# Altium footprint library hphonglib.PcbLib: 703 footprints (part 10 of 44)
Each footprint in its own frame and in the unit in brackets; x right, y up, seen from the top. Pads: shape width x height; smd on the part's side, far side on the other; paste and mask are expansions set on the pad; w line width, h text height; cw(c..) or ccw(c..) is an arc to the next point about the centre after c.
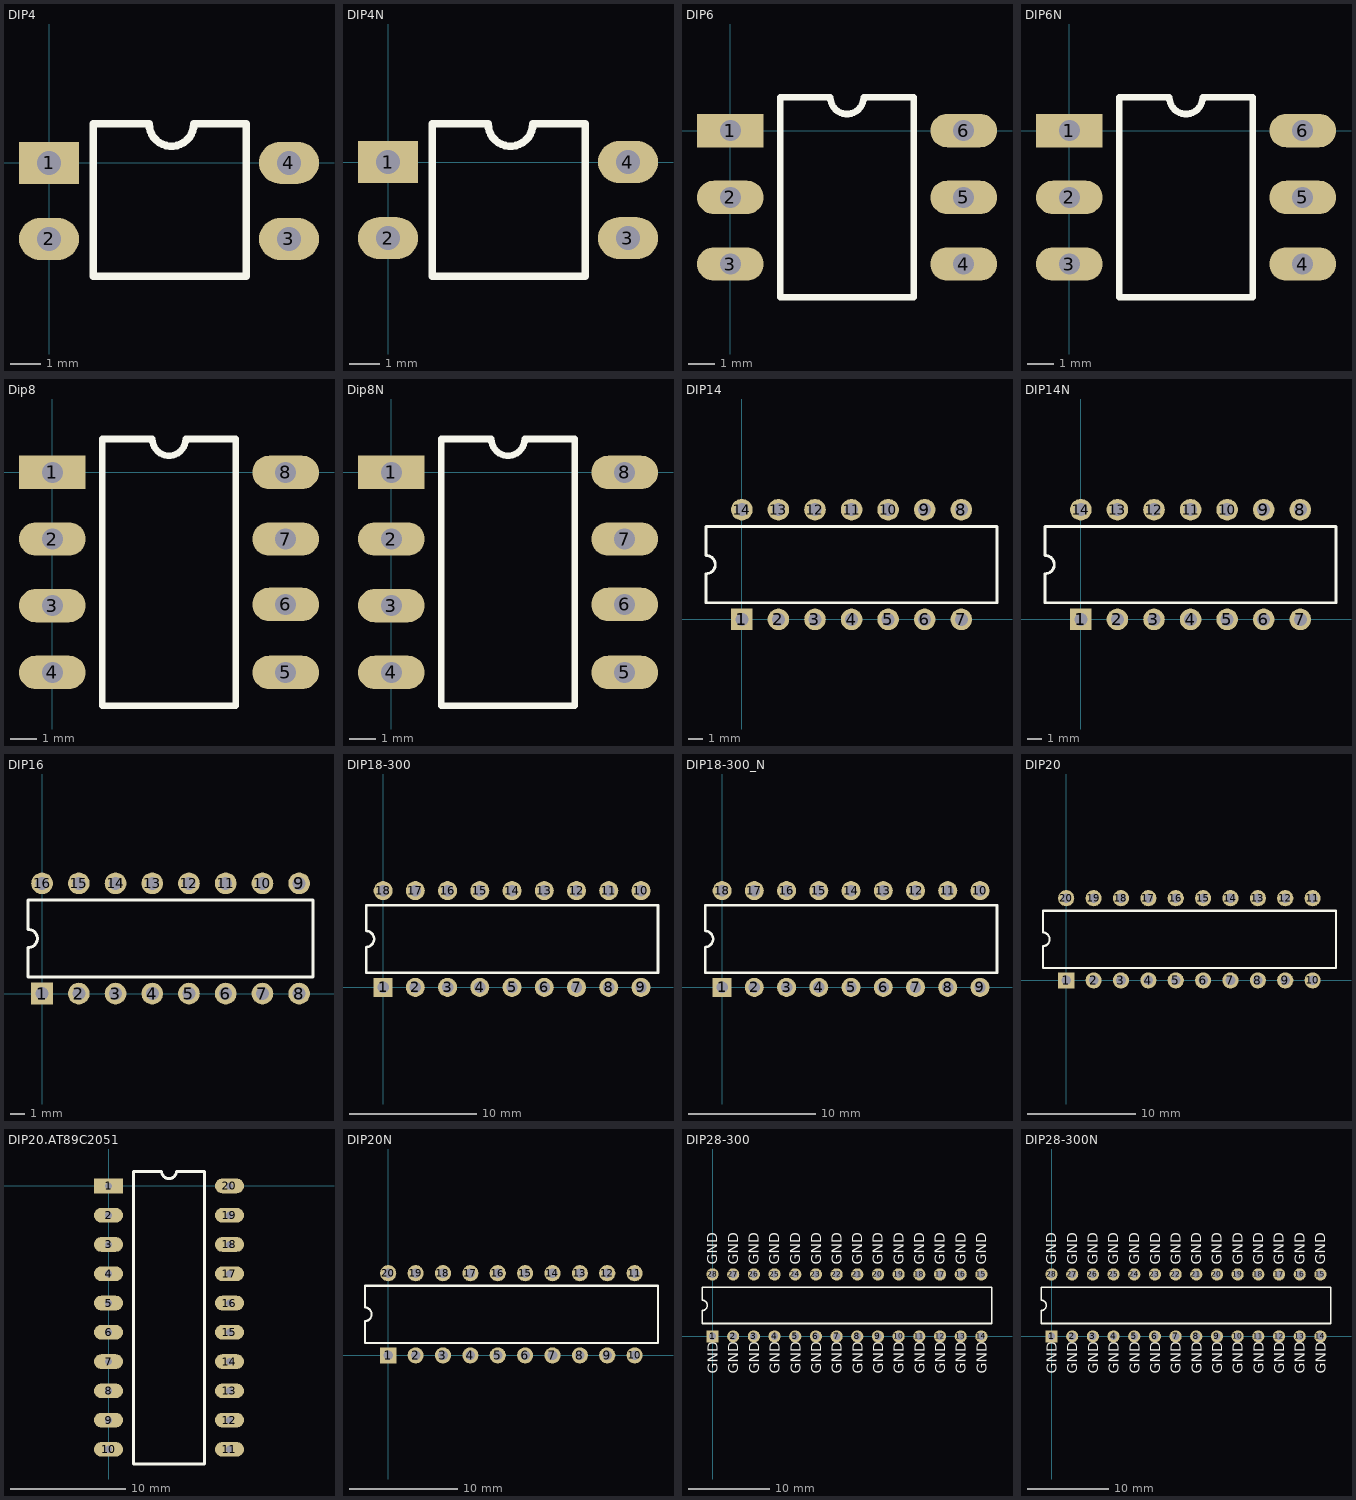
[diagram p9: the footprints below, top view; thin cyan lines are the x and y axes]

## DIP4 [mm]
pads (4):
  rect 2x1.4 hole 0.8: 1(0,0)
  oval 2x1.4 hole 0.8: 2(0,-2.54) 3(8,-2.54) 4(8,0)
Top Overlay:
  lines w0.254: 3.258,1.295 1.48,1.295 1.48,-3.785 6.57,-3.785 6.57,1.295 4.825,1.295 cw(c4.082,1.295) 3.34,1.295
3D body: height 3, standoff 0.5, extent -0.17,-3.281 0.18,-1.782
3D body: height 0.5, standoff -3.8, extent -0.17,-2.807 0.18,-2.257
3D body: height 3, standoff 2.65, extent 0.005,-0.741 1.705,0.758
3D body: height 3, standoff 0.5, extent -0.17,-0.741 0.18,0.758
3D body: height 0.5, standoff -3.8, extent -0.17,-0.267 0.18,0.283
3D body: height 3, standoff 2.65, extent 0.005,-3.282 1.705,-1.782
3D body: height 5.3, standoff 0.3, extent 1.48,-3.725 6.58,1.295
3D body: height 3, standoff 2.65, extent 6.31,-0.757 8.01,0.743
3D body: height 3, standoff 0.5, extent 7.835,-0.757 8.185,0.743
3D body: height 0.5, standoff -3.8, extent 7.835,-0.282 8.185,0.268
3D body: height 3, standoff 0.5, extent 7.835,-3.297 8.185,-1.797
3D body: height 0.5, standoff -3.8, extent 7.835,-2.822 8.185,-2.272
3D body: height 3, standoff 2.65, extent 6.31,-3.297 8.01,-1.797
3D body: height 5.4, standoff 4, extent 3.086,0.333 5.103,1.341

## DIP4N [mm]
pads (4):
  rect 2x1.4 hole 0.8: 1(0,0)
  oval 2x1.4 hole 0.8: 2(0,-2.54) 3(8,-2.54) 4(8,0)
Top Overlay:
  lines w0.254: 3.258,1.27 1.48,1.27 1.48,-3.81 6.57,-3.81 6.57,1.27 4.825,1.27 cw(c4.082,1.27) 3.34,1.27
3D body: height 4.81, standoff -2.78, extent -0.025,-4.015 7.975,1.525

## DIP6 [mm]
pads (6):
  rect 2.54x1.27 hole 0.8: 1(0,0)
  oval 2.54x1.27 hole 0.8: 2(0,-2.54) 3(0,-5.08) 4(8.89,-5.08) 5(8.89,-2.54) 6(8.89,0)
Top Overlay:
  lines w0.254: 1.905,-6.35 6.985,-6.35 6.985,1.27 5.08,1.27 cw(c4.445,1.27) 3.81,1.27 1.905,1.27 1.905,-6.35
3D body: height 5.3, standoff 0.3, extent 1.905,-6.35 6.985,1.287
3D body: height 3, standoff 2.65, extent 0.205,-0.75 1.905,0.75
3D body: height 3, standoff 0.5, extent 0.03,-0.75 0.38,0.75
3D body: height 0.5, standoff -3.8, extent 0.03,-0.275 0.38,0.275
3D body: height 3, standoff 2.65, extent 0.205,-3.29 1.905,-1.79
3D body: height 3, standoff 0.5, extent 0.03,-3.29 0.38,-1.79
3D body: height 0.5, standoff -3.8, extent 0.03,-2.815 0.38,-2.265
3D body: height 3, standoff 2.65, extent 0.205,-5.83 1.905,-4.33
3D body: height 3, standoff 0.5, extent 0.03,-5.83 0.38,-4.33
3D body: height 0.5, standoff -3.8, extent 0.03,-5.355 0.38,-4.805
3D body: height 3, standoff 2.65, extent 6.985,-5.83 8.685,-4.33
3D body: height 3, standoff 0.5, extent 8.51,-5.83 8.86,-4.33
3D body: height 0.5, standoff -3.8, extent 8.51,-5.355 8.86,-4.805
3D body: height 3, standoff 2.65, extent 6.985,-3.29 8.685,-1.79
3D body: height 3, standoff 0.5, extent 8.51,-3.29 8.86,-1.79
3D body: height 0.5, standoff -3.8, extent 8.51,-2.815 8.86,-2.265
3D body: height 3, standoff 2.65, extent 6.985,-0.75 8.685,0.75
3D body: height 3, standoff 0.5, extent 8.51,-0.75 8.86,0.75
3D body: height 0.5, standoff -3.8, extent 8.51,-0.275 8.86,0.275
3D body: height 5.4, standoff 4, extent 3.441,0.278 5.458,1.287

## DIP6N [mm]
pads (6):
  rect 2.54x1.27 hole 0.8: 1(0,0)
  oval 2.54x1.27 hole 0.8: 2(0,-2.54) 3(0,-5.08) 4(8.89,-5.08) 5(8.89,-2.54) 6(8.89,0)
Top Overlay:
  lines w0.254: 1.905,-6.35 6.985,-6.35 6.985,1.27 5.08,1.27 cw(c4.445,1.27) 3.81,1.27 1.905,1.27 1.905,-6.35
3D body: height 4.51, standoff -3.08, extent 0.475,-6.53 8.475,1.55

## Dip8 [mm] "Dual Inline Package 8 pins"
pads (8):
  rect 2.54x1.27 hole 0.8: 1(0,0)
  oval 2.54x1.27 hole 0.8: 2(0,-2.54) 3(0,-5.08) 4(0,-7.62) 5(8.89,-7.62) 6(8.89,-5.03) 7(8.89,-2.54) 8(8.89,0)
Top Overlay:
  lines w0.254: 1.905,-8.89 6.985,-8.89 6.985,1.27 5.08,1.27 cw(c4.445,1.27) 3.81,1.27 1.905,1.27 1.905,-8.89
3D body: height 0.5, standoff -3.8, extent 8.42,-7.945 8.77,-7.395
3D body: height 3, standoff 0.5, extent 8.42,-8.42 8.77,-6.92
3D body: height 3, standoff 2.65, extent 6.895,-8.37 8.595,-6.87
3D body: height 3, standoff 2.65, extent 0.205,-8.37 1.905,-6.87
3D body: height 5.3, standoff 0.3, extent 1.905,-8.89 6.985,1.27
3D body: height 3, standoff 2.65, extent 0.205,-0.75 1.905,0.75
3D body: height 3, standoff 0.5, extent 0.03,-0.75 0.38,0.75
3D body: height 0.5, standoff -3.8, extent 0.03,-0.275 0.38,0.275
3D body: height 3, standoff 2.65, extent 0.205,-3.29 1.905,-1.79
3D body: height 3, standoff 0.5, extent 0.03,-3.29 0.38,-1.79
3D body: height 0.5, standoff -3.8, extent 0.03,-2.815 0.38,-2.265
3D body: height 3, standoff 2.65, extent 0.205,-5.83 1.905,-4.33
3D body: height 3, standoff 0.5, extent 0.03,-5.83 0.38,-4.33
3D body: height 0.5, standoff -3.8, extent 0.03,-5.355 0.38,-4.805
3D body: height 3, standoff 2.65, extent 6.895,-5.83 8.595,-4.33
3D body: height 3, standoff 0.5, extent 8.42,-5.83 8.77,-4.33
3D body: height 0.5, standoff -3.8, extent 8.42,-5.355 8.77,-4.805
3D body: height 3, standoff 2.65, extent 6.895,-3.29 8.595,-1.79
3D body: height 3, standoff 0.5, extent 8.42,-3.29 8.77,-1.79
3D body: height 0.5, standoff -3.8, extent 8.42,-2.815 8.77,-2.265
3D body: height 3, standoff 2.65, extent 6.895,-0.75 8.595,0.75
3D body: height 3, standoff 0.5, extent 8.42,-0.75 8.77,0.75
3D body: height 0.5, standoff -3.8, extent 8.42,-0.275 8.77,0.275
3D body: height 0.5, standoff -3.8, extent 0.03,-7.895 0.38,-7.345
3D body: height 3, standoff 0.5, extent 0.03,-8.37 0.38,-6.87
3D body: height 5.4, standoff 4, extent 3.441,0.261 5.458,1.27

## Dip8N [mm] "Dual Inline Package 8 pins"
pads (8):
  rect 2.54x1.27 hole 0.8: 1(0,0)
  oval 2.54x1.27 hole 0.8: 2(0,-2.54) 3(0,-5.08) 4(0,-7.62) 5(8.89,-7.62) 6(8.89,-5.03) 7(8.89,-2.54) 8(8.89,0)
Top Overlay:
  lines w0.254: 1.905,-8.89 1.905,1.27 3.81,1.27 ccw(c4.445,1.27) 5.08,1.27 6.985,1.27 6.985,-8.89 1.905,-8.89
3D body: height 5.19, standoff -1.67, extent 0.538,-9.55 8.412,1.88

## DIP14 [mm] "DIP; 14 Leads; Row Spacing 7.62 mm; Pitch 2.54 mm"
height 4.42
pads (14):
  rect 1.5x1.5 hole 0.9: 1(0,0)
  round 1.5 hole 0.9: 2(2.54,0) 3(5.08,0) 4(7.62,0) 5(10.16,0) 6(12.7,0) 7(15.24,0) 8(15.24,7.62) 9(12.7,7.62) 10(10.16,7.62) 11(7.62,7.62) 12(5.08,7.62) 13(2.54,7.62) 14(0,7.62)
Top Overlay:
  lines w0.2: -2.48,1.16 17.72,1.16 17.72,6.46 -2.48,6.46 -2.48,4.445 cw(c-2.48,3.81) -2.48,3.175 -2.48,1.16
Bottom Overlay:
  lines w0.254: -1.475,-1.175 17,-1.175 17,8.875 -1.475,8.875 -1.475,-1.175

## DIP14N [mm] "DIP; 14 Leads; Row Spacing 7.62 mm; Pitch 2.54 mm"
height 4.42
pads (14):
  rect 1.5x1.5 hole 0.9: 1(0,0)
  round 1.5 hole 0.9: 2(2.54,0) 3(5.08,0) 4(7.62,0) 5(10.16,0) 6(12.7,0) 7(15.24,0) 8(15.24,7.62) 9(12.7,7.62) 10(10.16,7.62) 11(7.62,7.62) 12(5.08,7.62) 13(2.54,7.62) 14(0,7.62)
Top Overlay:
  lines w0.2: -2.48,1.16 -2.48,3.175 ccw(c-2.48,3.81) -2.48,4.445 -2.48,6.46 17.72,6.46 17.72,1.16 -2.48,1.16
Bottom Overlay:
  lines w0.254: -2.25,-1.175 -2.25,8.875 17.55,8.875 17.55,-1.175 -2.25,-1.175
3D body: height 5.58, standoff -1.99, extent -2.25,-0.145 17.25,7.725

## DIP16 [mm] "DIP; 16 Leads; Row Spacing 7.62 mm; Pitch 2.54 mm"
height 4.58
pads (16):
  rect 1.5x1.5 hole 0.9: 1(0,0)
  round 1.5 hole 0.9: 2(2.54,0) 3(5.08,0) 4(7.62,0) 5(10.16,0) 6(12.7,0) 7(15.24,0) 8(17.78,0) 9(17.78,7.62) 10(15.24,7.62) 11(12.7,7.62) 12(10.16,7.62) 13(7.62,7.62) 14(5.08,7.62) 15(2.54,7.62) 16(0,7.62)
Top Overlay:
  lines w0.2: -0.96,1.16 -0.96,3.175 ccw(c-0.96,3.81) -0.96,4.445 -0.96,6.46 18.74,6.46 18.74,1.16 -0.96,1.16
Bottom Overlay:
  lines w0.254: -1.35,-1.175 -1.35,8.725 19.15,8.725 19.15,-1.175 -1.35,-1.175
3D body: height 5.08, standoff -2.49, extent -1.15,-0.145 18.85,7.725

## DIP18-300 [mm] "DIP, Plastic; 18 Leads; Row Spacing 7.62 mm; Pitch 2.54 mm"
height 4.32
pads (18):
  rect 1.5x1.5 hole 0.9: 1(0,0)
  round 1.5 hole 0.9: 2(2.54,0) 3(5.08,0) 4(7.62,0) 5(10.16,0) 6(12.7,0) 7(15.24,0) 8(17.78,0) 9(20.32,0) 10(20.32,7.62) 11(17.78,7.62) 12(15.24,7.62) 13(12.7,7.62) 14(10.16,7.62) 15(7.62,7.62) 16(5.08,7.62) 17(2.54,7.62) 18(0,7.62)
Top Overlay:
  lines w0.2: -1.34,1.16 21.66,1.16 21.66,6.46 -1.34,6.46 -1.34,4.445 cw(c-1.34,3.81) -1.34,3.175 -1.34,1.16

## DIP18-300_N [mm] "DIP, Plastic; 18 Leads; Row Spacing 7.62 mm; Pitch 2.54 mm"
height 4.32
pads (18):
  rect 1.5x1.5 hole 0.9: 1(0,0)
  round 1.5 hole 0.9: 2(2.54,0) 3(5.08,0) 4(7.62,0) 5(10.16,0) 6(12.7,0) 7(15.24,0) 8(17.78,0) 9(20.32,0) 10(20.32,7.62) 11(17.78,7.62) 12(15.24,7.62) 13(12.7,7.62) 14(10.16,7.62) 15(7.62,7.62) 16(5.08,7.62) 17(2.54,7.62) 18(0,7.62)
Top Overlay:
  lines w0.2: -1.34,1.16 -1.34,3.175 ccw(c-1.34,3.81) -1.34,4.445 -1.34,6.46 21.66,6.46 21.66,1.16 -1.34,1.16

## DIP20 [mm] "DIP; 20 Leads; Row Spacing 7.62 mm; Pitch 2.54 mm"
height 4.58
pads (20):
  rect 1.5x1.5 hole 0.9: 1(0,0)
  round 1.5 hole 0.9: 2(2.54,0) 3(5.08,0) 4(7.62,0) 5(10.16,0) 6(12.7,0) 7(15.24,0) 8(17.78,0) 9(20.32,0) 10(22.86,0) 11(22.86,7.62) 12(20.32,7.62) 13(17.78,7.62) 14(15.24,7.62) 15(12.7,7.62) 16(10.16,7.62) 17(7.62,7.62) 18(5.08,7.62) 19(2.54,7.62) 20(0,7.62)
Top Overlay:
  lines w0.2: -2.17,1.16 -2.17,3.175 ccw(c-2.17,3.81) -2.17,4.445 -2.17,6.46 25.03,6.46 25.03,1.16 -2.17,1.16
Bottom Overlay:
  lines w0.254: -1.3,-1.15 24.2,-1.15 24.2,8.825 -1.3,8.825 -1.3,-1.15
3D body: height 0.5, standoff -3.8, extent -0.26,-0.195 0.29,0.155
3D body: height 3, standoff 0.5, extent -0.735,-0.195 0.765,0.155
3D body: height 3, standoff 2.65, extent -0.735,-0.02 0.765,1.68
3D body: height 0.5, standoff -3.8, extent 2.28,-0.195 2.83,0.155
3D body: height 3, standoff 0.5, extent 1.805,-0.195 3.305,0.155
3D body: height 3, standoff 2.65, extent 1.805,-0.02 3.305,1.68
3D body: height 0.5, standoff -3.8, extent 4.82,-0.195 5.37,0.155
3D body: height 3, standoff 0.5, extent 4.345,-0.195 5.845,0.155
3D body: height 3, standoff 2.65, extent 4.345,-0.02 5.845,1.68
3D body: height 0.5, standoff -3.8, extent 7.36,-0.195 7.91,0.155
3D body: height 3, standoff 0.5, extent 6.885,-0.195 8.385,0.155
3D body: height 3, standoff 2.65, extent 6.885,-0.02 8.385,1.68
3D body: height 0.5, standoff -3.8, extent 9.9,-0.195 10.45,0.155
3D body: height 3, standoff 0.5, extent 9.425,-0.195 10.925,0.155
3D body: height 3, standoff 2.65, extent 9.425,-0.02 10.925,1.68
3D body: height 0.5, standoff -3.8, extent 12.44,-0.195 12.99,0.155
3D body: height 3, standoff 0.5, extent 11.965,-0.195 13.465,0.155
3D body: height 3, standoff 2.65, extent 11.965,-0.02 13.465,1.68
3D body: height 0.5, standoff -3.8, extent 14.98,-0.195 15.53,0.155
3D body: height 3, standoff 0.5, extent 14.505,-0.195 16.005,0.155
3D body: height 3, standoff 2.65, extent 14.505,-0.02 16.005,1.68
3D body: height 0.5, standoff -3.8, extent 17.52,-0.195 18.07,0.155
3D body: height 3, standoff 0.5, extent 17.045,-0.195 18.545,0.155
3D body: height 3, standoff 2.65, extent 17.045,-0.02 18.545,1.68
3D body: height 0.5, standoff -3.8, extent 20.06,-0.195 20.61,0.155
3D body: height 3, standoff 0.5, extent 19.585,-0.195 21.085,0.155
3D body: height 3, standoff 2.65, extent 19.585,-0.02 21.085,1.68
3D body: height 0.5, standoff -3.8, extent 22.6,-0.195 23.15,0.155
3D body: height 3, standoff 0.5, extent 22.125,-0.195 23.625,0.155
3D body: height 3, standoff 2.65, extent 22.125,-0.02 23.625,1.68
3D body: height 3, standoff 2.65, extent -0.765,5.94 0.735,7.64
3D body: height 3, standoff 0.5, extent -0.765,7.465 0.735,7.815
3D body: height 0.5, standoff -3.8, extent -0.29,7.465 0.26,7.815
3D body: height 3, standoff 2.65, extent 1.775,5.94 3.275,7.64
3D body: height 3, standoff 0.5, extent 1.775,7.465 3.275,7.815
3D body: height 0.5, standoff -3.8, extent 2.25,7.465 2.8,7.815
3D body: height 3, standoff 2.65, extent 4.315,5.94 5.815,7.64
3D body: height 3, standoff 0.5, extent 4.315,7.465 5.815,7.815
3D body: height 0.5, standoff -3.8, extent 4.79,7.465 5.34,7.815
3D body: height 3, standoff 2.65, extent 6.855,5.94 8.355,7.64
3D body: height 3, standoff 0.5, extent 6.855,7.465 8.355,7.815
3D body: height 0.5, standoff -3.8, extent 7.33,7.465 7.88,7.815
3D body: height 3, standoff 2.65, extent 9.395,5.94 10.895,7.64
3D body: height 3, standoff 0.5, extent 9.395,7.465 10.895,7.815
3D body: height 0.5, standoff -3.8, extent 9.87,7.465 10.42,7.815
3D body: height 3, standoff 2.65, extent 11.935,5.94 13.435,7.64
3D body: height 3, standoff 0.5, extent 11.935,7.465 13.435,7.815
3D body: height 0.5, standoff -3.8, extent 12.41,7.465 12.96,7.815
3D body: height 3, standoff 2.65, extent 14.475,5.94 15.975,7.64
3D body: height 3, standoff 0.5, extent 14.475,7.465 15.975,7.815
3D body: height 0.5, standoff -3.8, extent 14.95,7.465 15.5,7.815
3D body: height 3, standoff 2.65, extent 17.015,5.94 18.515,7.64
3D body: height 3, standoff 0.5, extent 17.015,7.465 18.515,7.815
3D body: height 0.5, standoff -3.8, extent 17.49,7.465 18.04,7.815
3D body: height 3, standoff 2.65, extent 19.555,5.94 21.055,7.64
3D body: height 3, standoff 0.5, extent 19.555,7.465 21.055,7.815
3D body: height 0.5, standoff -3.8, extent 20.03,7.465 20.58,7.815
3D body: height 3, standoff 2.65, extent 22.095,5.94 23.595,7.64
3D body: height 3, standoff 0.5, extent 22.095,7.465 23.595,7.815
3D body: height 0.5, standoff -3.8, extent 22.57,7.465 23.12,7.815
3D body: height 5.3, standoff 0.3, extent -1.295,1.255 24.105,6.335
3D body: height 5.4, standoff 4, extent -1.295,2.791 -0.286,4.808

## DIP20.AT89C2051 [mm]
pads (20):
  rect 2.54x1.27 hole 0.635: 1(0,0)
  oval 2.54x1.27 hole 0.635: 2(0,-2.54) 3(0,-5.08) 4(0,-7.62) 5(0,-10.16) 6(0,-12.7) 7(0,-15.24) 8(0,-17.78) 9(0,-20.32) 10(0,-22.86) 11(10.5,-22.86) 12(10.5,-20.32) 13(10.5,-17.78) 14(10.5,-15.24) 15(10.5,-12.7) 16(10.5,-10.16) 17(10.5,-7.62) 18(10.5,-5.08) 19(10.5,-2.54) 20(10.5,0)
Top Overlay:
  lines w0.254: 2.159,-24.13 2.159,1.27 4.615,1.27 ccw(c5.25,1.27) 5.885,1.27 8.341,1.27 8.341,-24.13 2.159,-24.13
3D body: height 5.3, standoff 0.3, extent 1.7,-25.025 8.8,1.975
3D body: height 3, standoff 2.65, extent 0,-0.75 1.7,0.75
3D body: height 3, standoff 0.5, extent -0.175,-0.75 0.175,0.75
3D body: height 0.5, standoff -3.8, extent -0.175,-0.275 0.175,0.275
3D body: height 0.5, standoff -3.8, extent -0.175,-2.815 0.175,-2.265
3D body: height 3, standoff 0.5, extent -0.175,-3.29 0.175,-1.79
3D body: height 3, standoff 2.65, extent 0,-3.29 1.7,-1.79
3D body: height 0.5, standoff -3.8, extent -0.175,-5.355 0.175,-4.805
3D body: height 3, standoff 0.5, extent -0.175,-5.83 0.175,-4.33
3D body: height 3, standoff 2.65, extent 0,-5.83 1.7,-4.33
3D body: height 0.5, standoff -3.8, extent -0.175,-7.895 0.175,-7.345
3D body: height 3, standoff 0.5, extent -0.175,-8.37 0.175,-6.87
3D body: height 3, standoff 2.65, extent 0,-8.37 1.7,-6.87
3D body: height 0.5, standoff -3.8, extent -0.175,-10.435 0.175,-9.885
3D body: height 3, standoff 0.5, extent -0.175,-10.91 0.175,-9.41
3D body: height 3, standoff 2.65, extent 0,-10.91 1.7,-9.41
3D body: height 0.5, standoff -3.8, extent -0.175,-12.975 0.175,-12.425
3D body: height 3, standoff 0.5, extent -0.175,-13.45 0.175,-11.95
3D body: height 3, standoff 2.65, extent 0,-13.45 1.7,-11.95
3D body: height 0.5, standoff -3.8, extent -0.175,-15.515 0.175,-14.965
3D body: height 3, standoff 0.5, extent -0.175,-15.99 0.175,-14.49
3D body: height 3, standoff 2.65, extent 0,-15.99 1.7,-14.49
3D body: height 0.5, standoff -3.8, extent -0.175,-18.055 0.175,-17.505
3D body: height 3, standoff 0.5, extent -0.175,-18.53 0.175,-17.03
3D body: height 3, standoff 2.65, extent 0,-18.53 1.7,-17.03
3D body: height 0.5, standoff -3.8, extent -0.175,-20.595 0.175,-20.045
3D body: height 3, standoff 0.5, extent -0.175,-21.07 0.175,-19.57
3D body: height 3, standoff 2.65, extent 0,-21.07 1.7,-19.57
3D body: height 0.5, standoff -3.8, extent -0.175,-23.135 0.175,-22.585
3D body: height 3, standoff 0.5, extent -0.175,-23.61 0.175,-22.11
3D body: height 3, standoff 2.65, extent 0,-23.61 1.7,-22.11
3D body: height 0.5, standoff -3.8, extent 10.325,-23.135 10.675,-22.585
3D body: height 3, standoff 0.5, extent 10.325,-23.61 10.675,-22.11
3D body: height 3, standoff 2.65, extent 8.8,-23.61 10.5,-22.11
3D body: height 0.5, standoff -3.8, extent 10.325,-20.595 10.675,-20.045
3D body: height 3, standoff 0.5, extent 10.325,-21.07 10.675,-19.57
3D body: height 3, standoff 2.65, extent 8.8,-21.07 10.5,-19.57
3D body: height 0.5, standoff -3.8, extent 10.325,-18.055 10.675,-17.505
3D body: height 3, standoff 0.5, extent 10.325,-18.53 10.675,-17.03
3D body: height 3, standoff 2.65, extent 8.8,-18.53 10.5,-17.03
3D body: height 0.5, standoff -3.8, extent 10.325,-15.515 10.675,-14.965
3D body: height 3, standoff 0.5, extent 10.325,-15.99 10.675,-14.49
3D body: height 3, standoff 2.65, extent 8.8,-15.99 10.5,-14.49
3D body: height 0.5, standoff -3.8, extent 10.325,-12.975 10.675,-12.425
3D body: height 3, standoff 0.5, extent 10.325,-13.45 10.675,-11.95
3D body: height 3, standoff 2.65, extent 8.8,-13.45 10.5,-11.95
3D body: height 0.5, standoff -3.8, extent 10.325,-10.435 10.675,-9.885
3D body: height 3, standoff 0.5, extent 10.325,-10.91 10.675,-9.41
3D body: height 3, standoff 2.65, extent 8.8,-10.91 10.5,-9.41
3D body: height 0.5, standoff -3.8, extent 10.325,-7.895 10.675,-7.345
3D body: height 3, standoff 0.5, extent 10.325,-8.37 10.675,-6.87
3D body: height 3, standoff 2.65, extent 8.8,-8.37 10.5,-6.87
3D body: height 0.5, standoff -3.8, extent 10.325,-5.355 10.675,-4.805
3D body: height 3, standoff 0.5, extent 10.325,-5.83 10.675,-4.33
3D body: height 3, standoff 2.65, extent 8.8,-5.83 10.5,-4.33
3D body: height 0.5, standoff -3.8, extent 10.325,-2.815 10.675,-2.265
3D body: height 3, standoff 0.5, extent 10.325,-3.29 10.675,-1.79
3D body: height 3, standoff 2.65, extent 8.8,-3.29 10.5,-1.79
3D body: height 0.5, standoff -3.8, extent 10.325,-0.275 10.675,0.275
3D body: height 3, standoff 0.5, extent 10.325,-0.75 10.675,0.75
3D body: height 3, standoff 2.65, extent 8.8,-0.75 10.5,0.75
3D body: height 5.4, standoff 4, extent 4.246,0.991 6.263,2
3D body: height 5.3, standoff 5.29, extent 5.925,-2.5 7.175,-1.675
3D body: height 5.3, standoff 5.29, extent 5.925,-6.025 7.6,-2.228
3D body: height 5.3, standoff 5.29, extent 5.925,-4.112 7.187,-3
3D body: height 5.3, standoff 5.29, extent 5.925,-5.109 7.175,-4.25
3D body: height 5.3, standoff 5.29, extent 5.925,-6 7.175,-5.25
3D body: height 5.3, standoff 5.29, extent 5.525,-5.8 5.825,-1.675

## DIP20N [mm] "DIP; 20 Leads; Row Spacing 7.62 mm; Pitch 2.54 mm"
height 4.58
pads (20):
  rect 1.5x1.5 hole 0.9: 1(0,0)
  round 1.5 hole 0.9: 2(2.54,0) 3(5.08,0) 4(7.62,0) 5(10.16,0) 6(12.7,0) 7(15.24,0) 8(17.78,0) 9(20.32,0) 10(22.86,0) 11(22.86,7.62) 12(20.32,7.62) 13(17.78,7.62) 14(15.24,7.62) 15(12.7,7.62) 16(10.16,7.62) 17(7.62,7.62) 18(5.08,7.62) 19(2.54,7.62) 20(0,7.62)
Top Overlay:
  lines w0.2: -2.17,1.16 -2.17,3.175 ccw(c-2.17,3.81) -2.17,4.445 -2.17,6.46 25.03,6.46 25.03,1.16 -2.17,1.16
Bottom Overlay:
  lines w0.254: -1.65,-1.15 24.45,-1.15 24.45,8.825 -1.65,8.825 -1.65,-1.15
3D body: height 4.65, standoff -1.57, extent -1.525,-0.137 24.256,7.737

## DIP28-300 [mm] "DIP, Plastic, Skinny; 28 Leads; Row Spacing 7.62 mm; Pitch 2.54 mm"
height 4.07
pads (28):
  rect 1.5x1.5 hole 0.9: 1(0,0)
  round 1.5 hole 0.9: 2(2.54,0) 3(5.08,0) 4(7.62,0) 5(10.16,0) 6(12.7,0) 7(15.24,0) 8(17.78,0) 9(20.32,0) 10(22.86,0) 11(25.4,0) 12(27.94,0) 13(30.48,0) 14(33.02,0) 15(33.02,7.62) 16(30.48,7.62) 17(27.94,7.62) 18(25.4,7.62) 19(22.86,7.62) 20(20.32,7.62) 21(17.78,7.62) 22(15.24,7.62) 23(12.7,7.62) 24(10.16,7.62) 25(7.62,7.62) 26(5.08,7.62) 27(2.54,7.62) 28(0,7.62)
Top Overlay:
  lines w0.2: -1.27,1.585 34.29,1.585 34.29,6.035 -1.27,6.035 -1.27,4.445 cw(c-1.27,3.81) -1.27,3.175 -1.27,1.585
  text "GND" at 15.845,8.8 h1.27
  text "GND" at 13.33,8.78 h1.27
  text "GND" at 10.765,8.8 h1.27
  text "GND" at 8.225,8.8 h1.27
  text "GND" at 5.685,8.8 h1.27
  text "GND" at 3.145,8.8 h1.27
  text "GND" at 0.605,8.8 h1.27
  text "GND" at 18.385,8.8 h1.27
  text "GND" at 20.925,8.8 h1.27
  text "GND" at 23.465,8.8 h1.27
  text "GND" at 26.005,8.8 h1.27
  text "GND" at 28.545,8.8 h1.27
  text "GND" at 31.085,8.8 h1.27
  text "GND" at 31.13,-4.565 h1.27
  text "GND" at 33.67,-4.565 h1.27
  text "GND" at 33.625,8.8 h1.27
  text "GND" at 23.51,-4.565 h1.27
  text "GND" at 26.05,-4.565 h1.27
  text "GND" at 28.59,-4.565 h1.27
  text "GND" at 15.89,-4.565 h1.27
  text "GND" at 18.43,-4.565 h1.27
  text "GND" at 20.97,-4.565 h1.27
  text "GND" at 8.27,-4.565 h1.27
  text "GND" at 10.81,-4.565 h1.27
  text "GND" at 13.35,-4.565 h1.27
  text "GND" at 5.73,-4.565 h1.27
  text "GND" at 3.19,-4.565 h1.27
  text "GND" at 0.65,-4.565 h1.27
Bottom Overlay:
  lines w0.254: -1.35,-1.075 34.4,-1.075 34.4,8.8 -1.35,8.8 -1.35,-1.075
  text "GND" at -0.585,-4.85 h1.27
  text "GND" at 1.955,-4.85 h1.27
  text "GND" at 4.495,-4.85 h1.27
  text "GND" at 7.035,-4.85 h1.27
  text "GND" at 9.575,-4.85 h1.27
  text "GND" at 12.115,-4.85 h1.27
  text "GND" at 14.655,-4.85 h1.27
  text "GND" at 17.195,-4.85 h1.27
  text "GND" at 19.735,-4.85 h1.27
  text "GND" at 22.275,-4.85 h1.27
  text "GND" at 24.815,-4.85 h1.27
  text "GND" at 27.355,-4.85 h1.27
  text "GND" at 29.835,-4.875 h1.27
  text "GND" at 32.375,-4.875 h1.27
  text "GND" at 33.65,12.7 h1.27
  text "GND" at 31.11,12.7 h1.27
  text "GND" at 28.57,12.7 h1.27
  text "GND" at 20.95,12.7 h1.27
  text "GND" at 23.49,12.7 h1.27
  text "GND" at 26.03,12.7 h1.27
  text "GND" at 13.33,12.7 h1.27
  text "GND" at 15.87,12.7 h1.27
  text "GND" at 18.41,12.7 h1.27
  text "GND" at 5.71,12.7 h1.27
  text "GND" at 8.25,12.7 h1.27
  text "GND" at 10.79,12.7 h1.27
  text "GND" at 0.63,12.7 h1.27
  text "GND" at 3.17,12.7 h1.27
3D body: height 5.3, standoff 0.3, extent -1.245,1.305 34.325,6.385
3D body: height 3, standoff 0.5, extent 1.775,7.455 3.275,7.805
3D body: height 3, standoff 2.65, extent 1.775,6.375 3.275,7.625
3D body: height 0.5, standoff -3.8, extent 2.275,7.45 2.825,7.8
3D body: height 0.5, standoff -3.8, extent -0.265,7.45 0.285,7.8
3D body: height 3, standoff 2.65, extent -0.765,6.375 0.735,7.625
3D body: height 3, standoff 0.5, extent -0.765,7.455 0.735,7.805
3D body: height 3, standoff 0.5, extent 4.315,7.455 5.815,7.805
3D body: height 3, standoff 2.65, extent 4.315,6.375 5.815,7.625
3D body: height 0.5, standoff -3.8, extent 4.815,7.45 5.365,7.8
3D body: height 3, standoff 0.5, extent 6.855,7.455 8.355,7.805
3D body: height 3, standoff 2.65, extent 6.855,6.375 8.355,7.625
3D body: height 0.5, standoff -3.8, extent 7.355,7.45 7.905,7.8
3D body: height 3, standoff 0.5, extent 9.395,7.455 10.895,7.805
3D body: height 3, standoff 2.65, extent 9.395,6.375 10.895,7.625
3D body: height 0.5, standoff -3.8, extent 9.895,7.45 10.445,7.8
3D body: height 3, standoff 0.5, extent 11.935,7.455 13.435,7.805
3D body: height 3, standoff 2.65, extent 11.935,6.375 13.435,7.625
3D body: height 0.5, standoff -3.8, extent 12.435,7.45 12.985,7.8
3D body: height 3, standoff 0.5, extent 14.475,7.455 15.975,7.805
3D body: height 3, standoff 2.65, extent 14.475,6.375 15.975,7.625
3D body: height 0.5, standoff -3.8, extent 14.975,7.45 15.525,7.8
3D body: height 3, standoff 0.5, extent 17.015,7.455 18.515,7.805
3D body: height 3, standoff 2.65, extent 17.015,6.375 18.515,7.625
3D body: height 0.5, standoff -3.8, extent 17.515,7.45 18.065,7.8
3D body: height 3, standoff 0.5, extent 19.555,7.455 21.055,7.805
3D body: height 3, standoff 2.65, extent 19.555,6.375 21.055,7.625
3D body: height 0.5, standoff -3.8, extent 20.055,7.45 20.605,7.8
3D body: height 3, standoff 0.5, extent 22.095,7.455 23.595,7.805
3D body: height 3, standoff 2.65, extent 22.095,6.375 23.595,7.625
3D body: height 0.5, standoff -3.8, extent 22.595,7.45 23.145,7.8
3D body: height 3, standoff 0.5, extent 24.635,7.455 26.135,7.805
3D body: height 3, standoff 2.65, extent 24.635,6.375 26.135,7.625
3D body: height 0.5, standoff -3.8, extent 25.135,7.45 25.685,7.8
3D body: height 3, standoff 0.5, extent 27.175,7.455 28.675,7.805
3D body: height 3, standoff 2.65, extent 27.175,6.375 28.675,7.625
3D body: height 0.5, standoff -3.8, extent 27.675,7.45 28.225,7.8
3D body: height 3, standoff 0.5, extent 29.715,7.455 31.215,7.805
3D body: height 3, standoff 2.65, extent 29.715,6.375 31.215,7.625
3D body: height 0.5, standoff -3.8, extent 30.215,7.45 30.765,7.8
3D body: height 3, standoff 0.5, extent 32.255,7.455 33.755,7.805
3D body: height 3, standoff 2.65, extent 32.255,6.375 33.755,7.625
3D body: height 0.5, standoff -3.8, extent 32.755,7.45 33.305,7.8
3D body: height 3, standoff 0.5, extent 32.285,-0.185 33.785,0.165
3D body: height 3, standoff 2.65, extent 32.285,-0.005 33.785,1.245
3D body: height 0.5, standoff -3.8, extent 32.735,-0.18 33.285,0.17
3D body: height 3, standoff 0.5, extent 29.745,-0.185 31.245,0.165
3D body: height 3, standoff 2.65, extent 29.745,-0.005 31.245,1.245
3D body: height 0.5, standoff -3.8, extent 30.195,-0.18 30.745,0.17
3D body: height 3, standoff 0.5, extent 27.205,-0.185 28.705,0.165
3D body: height 3, standoff 2.65, extent 27.205,-0.005 28.705,1.245
3D body: height 0.5, standoff -3.8, extent 27.655,-0.18 28.205,0.17
3D body: height 3, standoff 0.5, extent 24.665,-0.185 26.165,0.165
3D body: height 3, standoff 2.65, extent 24.665,-0.005 26.165,1.245
3D body: height 0.5, standoff -3.8, extent 25.115,-0.18 25.665,0.17
3D body: height 3, standoff 0.5, extent 22.125,-0.185 23.625,0.165
3D body: height 3, standoff 2.65, extent 22.125,-0.005 23.625,1.245
3D body: height 0.5, standoff -3.8, extent 22.575,-0.18 23.125,0.17
3D body: height 3, standoff 0.5, extent 19.585,-0.185 21.085,0.165
3D body: height 3, standoff 2.65, extent 19.585,-0.005 21.085,1.245
3D body: height 0.5, standoff -3.8, extent 20.035,-0.18 20.585,0.17
3D body: height 3, standoff 0.5, extent 17.045,-0.185 18.545,0.165
3D body: height 3, standoff 2.65, extent 17.045,-0.005 18.545,1.245
3D body: height 0.5, standoff -3.8, extent 17.495,-0.18 18.045,0.17
3D body: height 3, standoff 0.5, extent 14.505,-0.185 16.005,0.165
3D body: height 3, standoff 2.65, extent 14.505,-0.005 16.005,1.245
3D body: height 0.5, standoff -3.8, extent 14.955,-0.18 15.505,0.17
3D body: height 3, standoff 0.5, extent 11.965,-0.185 13.465,0.165
3D body: height 3, standoff 2.65, extent 11.965,-0.005 13.465,1.245
3D body: height 0.5, standoff -3.8, extent 12.415,-0.18 12.965,0.17
3D body: height 3, standoff 0.5, extent 9.425,-0.185 10.925,0.165
3D body: height 3, standoff 2.65, extent 9.425,-0.005 10.925,1.245
3D body: height 0.5, standoff -3.8, extent 9.875,-0.18 10.425,0.17
3D body: height 3, standoff 0.5, extent 6.885,-0.185 8.385,0.165
3D body: height 3, standoff 2.65, extent 6.885,-0.005 8.385,1.245
3D body: height 0.5, standoff -3.8, extent 7.335,-0.18 7.885,0.17
3D body: height 3, standoff 0.5, extent 4.345,-0.185 5.845,0.165
3D body: height 3, standoff 2.65, extent 4.345,-0.005 5.845,1.245
3D body: height 0.5, standoff -3.8, extent 4.795,-0.18 5.345,0.17
3D body: height 3, standoff 0.5, extent -0.735,-0.185 0.765,0.165
3D body: height 3, standoff 2.65, extent -0.735,-0.005 0.765,1.245
3D body: height 0.5, standoff -3.8, extent -0.285,-0.18 0.265,0.17
3D body: height 3, standoff 0.5, extent 1.805,-0.185 3.305,0.165
3D body: height 3, standoff 2.65, extent 1.805,-0.005 3.305,1.245
3D body: height 0.5, standoff -3.8, extent 2.255,-0.18 2.805,0.17
3D body: height 5.4, standoff 4, extent -1.245,2.841 -0.236,4.858

## DIP28-300N [mm] "DIP, Plastic, Skinny; 28 Leads; Row Spacing 7.62 mm; Pitch 2.54 mm"
height 4.07
pads (28):
  rect 1.5x1.5 hole 0.9: 1(0,0)
  round 1.5 hole 0.9: 2(2.54,0) 3(5.08,0) 4(7.62,0) 5(10.16,0) 6(12.7,0) 7(15.24,0) 8(17.78,0) 9(20.32,0) 10(22.86,0) 11(25.4,0) 12(27.94,0) 13(30.48,0) 14(33.02,0) 15(33.02,7.62) 16(30.48,7.62) 17(27.94,7.62) 18(25.4,7.62) 19(22.86,7.62) 20(20.32,7.62) 21(17.78,7.62) 22(15.24,7.62) 23(12.7,7.62) 24(10.16,7.62) 25(7.62,7.62) 26(5.08,7.62) 27(2.54,7.62) 28(0,7.62)
Top Overlay:
  lines w0.2: -1.27,1.585 34.29,1.585 34.29,6.035 -1.27,6.035 -1.27,4.445 cw(c-1.27,3.81) -1.27,3.175 -1.27,1.585
  text "GND" at 0.65,-4.565 h1.27
  text "GND" at 3.19,-4.565 h1.27
  text "GND" at 5.73,-4.565 h1.27
  text "GND" at 13.35,-4.565 h1.27
  text "GND" at 10.81,-4.565 h1.27
  text "GND" at 8.27,-4.565 h1.27
  text "GND" at 20.97,-4.565 h1.27
  text "GND" at 18.43,-4.565 h1.27
  text "GND" at 15.89,-4.565 h1.27
  text "GND" at 28.59,-4.565 h1.27
  text "GND" at 26.05,-4.565 h1.27
  text "GND" at 23.51,-4.565 h1.27
  text "GND" at 33.625,8.8 h1.27
  text "GND" at 33.67,-4.565 h1.27
  text "GND" at 31.13,-4.565 h1.27
  text "GND" at 31.085,8.8 h1.27
  text "GND" at 28.545,8.8 h1.27
  text "GND" at 26.005,8.8 h1.27
  text "GND" at 23.465,8.8 h1.27
  text "GND" at 20.925,8.8 h1.27
  text "GND" at 18.385,8.8 h1.27
  text "GND" at 0.605,8.8 h1.27
  text "GND" at 3.145,8.8 h1.27
  text "GND" at 5.685,8.8 h1.27
  text "GND" at 8.225,8.8 h1.27
  text "GND" at 10.765,8.8 h1.27
  text "GND" at 13.33,8.78 h1.27
  text "GND" at 15.845,8.8 h1.27
Bottom Overlay:
  lines w0.254: -1.35,-1.075 -1.35,8.8 34.4,8.8 34.4,-1.075 -1.35,-1.075
  text "GND" at 3.17,12.7 h1.27
  text "GND" at 0.63,12.7 h1.27
  text "GND" at 10.79,12.7 h1.27
  text "GND" at 8.25,12.7 h1.27
  text "GND" at 5.71,12.7 h1.27
  text "GND" at 18.41,12.7 h1.27
  text "GND" at 15.87,12.7 h1.27
  text "GND" at 13.33,12.7 h1.27
  text "GND" at 26.03,12.7 h1.27
  text "GND" at 23.49,12.7 h1.27
  text "GND" at 20.95,12.7 h1.27
  text "GND" at 28.57,12.7 h1.27
  text "GND" at 31.11,12.7 h1.27
  text "GND" at 33.65,12.7 h1.27
  text "GND" at 32.375,-4.875 h1.27
  text "GND" at 29.835,-4.875 h1.27
  text "GND" at 27.355,-4.85 h1.27
  text "GND" at 24.815,-4.85 h1.27
  text "GND" at 22.275,-4.85 h1.27
  text "GND" at 19.735,-4.85 h1.27
  text "GND" at 17.195,-4.85 h1.27
  text "GND" at 14.655,-4.85 h1.27
  text "GND" at 12.115,-4.85 h1.27
  text "GND" at 9.575,-4.85 h1.27
  text "GND" at 7.035,-4.85 h1.27
  text "GND" at 4.495,-4.85 h1.27
  text "GND" at 1.955,-4.85 h1.27
  text "GND" at -0.585,-4.85 h1.27
3D body: height 3.65, standoff -2.57, extent -1.45,0.025 34.491,7.899